# Altium footprint library HamedLib.PcbLib: 221 footprints (part 7 of 14)
Each footprint in its own frame and in the unit in brackets; x right, y up, seen from the top. Pads: shape width x height; smd on the part's side, far side on the other; paste and mask are expansions set on the pad; w line width, h text height; cw(c..) or ccw(c..) is an arc to the next point about the centre after c.
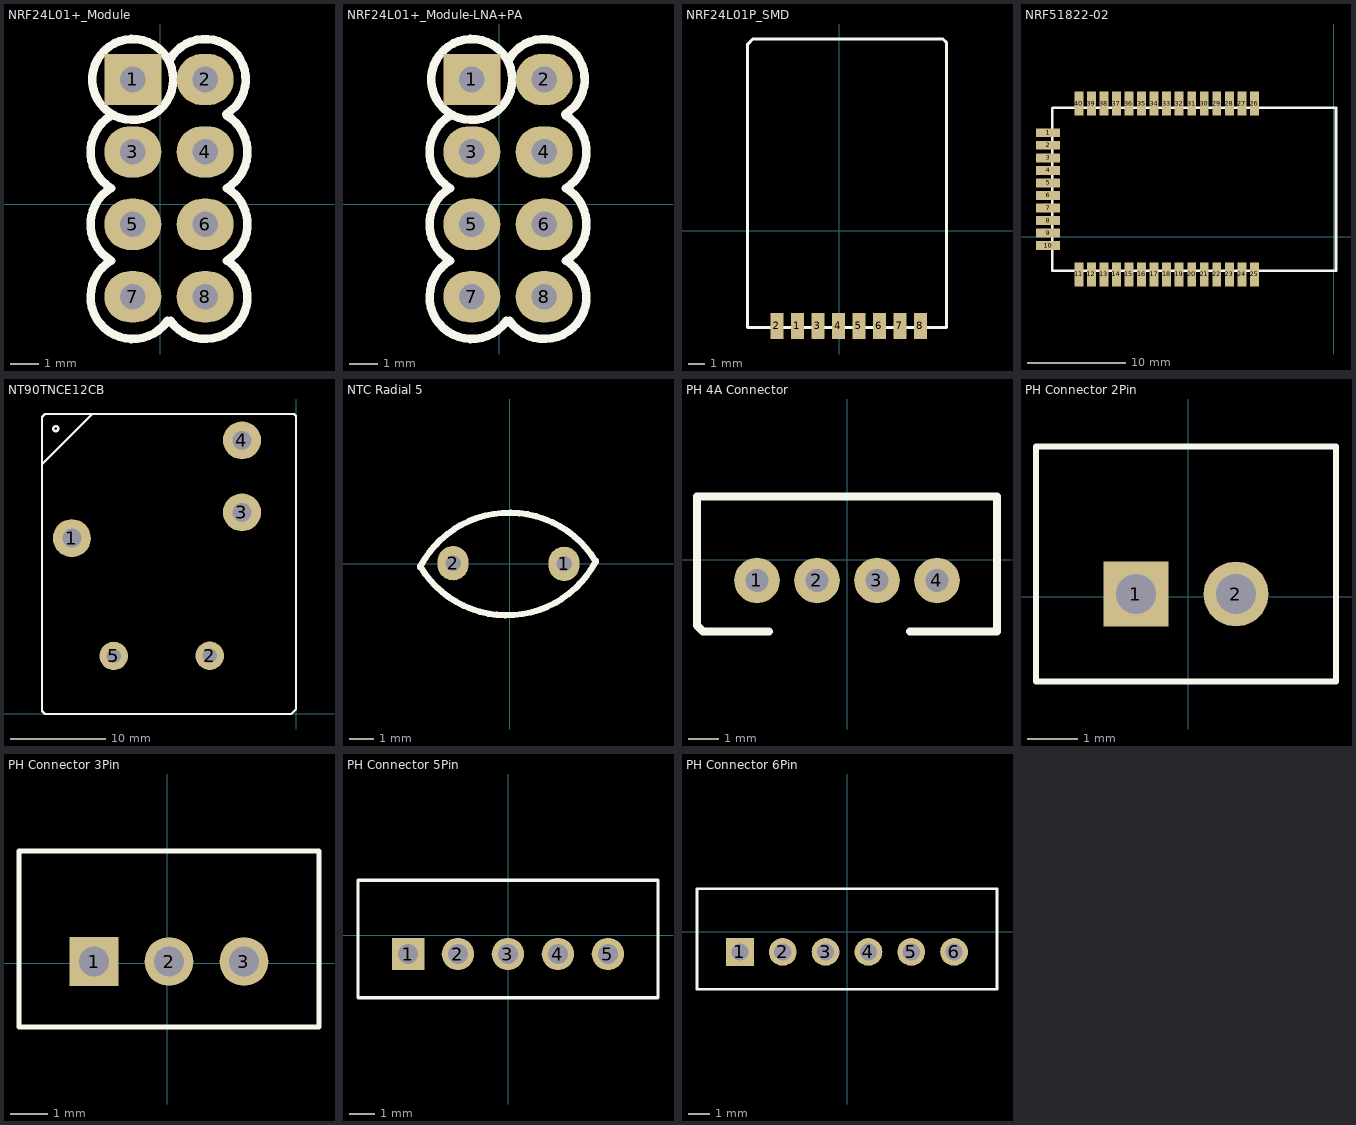
[diagram p6: the footprints below, top view; thin cyan lines are the x and y axes]

## NRF24L01+_Module [mm]
height 9
pads (8):
  rect 2x1.8 hole 0.9: 1(-0.965,4.369)
  oval 2x1.8 hole 0.9: 2(1.575,4.369) 3(-0.965,1.829) 4(1.575,1.829) 5(-0.965,-0.711) 6(1.575,-0.711) 7(-0.965,-3.251) 8(1.575,-3.251)
Top Overlay:
  circle w0.3: c-0.965,4.369 r1.42
  lines w0.3: -1.75,-1.995 ccw(c-0.965,-3.251) 0.248,-4.101 ; -1.727,-1.981 cw(c-0.965,-0.711) -1.727,0.559 cw(c-0.965,1.829) -1.727,3.099 ; 0.334,5.058 cw(c1.575,4.369) 2.305,3.151 ; 0.361,-4.101 ccw(c1.575,-3.251) 2.337,-1.981 ccw(c1.575,-0.711) 2.337,0.559 ccw(c1.575,1.829) 2.337,3.099
3D body "NRF24L01Module.STEP": height 9.1, standoff -1, extent -2.333,-9.082 26.667,5.918

## NRF24L01+_Module-LNA+PA [mm]
height 9
pads (8):
  rect 2x1.8 hole 0.9: 1(-0.965,4.369)
  oval 2x1.8 hole 0.9: 2(1.575,4.369) 3(-0.965,1.829) 4(1.575,1.829) 5(-0.965,-0.711) 6(1.575,-0.711) 7(-0.965,-3.251) 8(1.575,-3.251)
Top Overlay:
  circle w0.3: c-0.965,4.369 r1.42
  lines w0.3: -1.75,-1.995 ccw(c-0.965,-3.251) 0.248,-4.101 ; -1.727,-1.981 cw(c-0.965,-0.711) -1.727,0.559 cw(c-0.965,1.829) -1.727,3.099 ; 0.334,5.058 cw(c1.575,4.369) 2.305,3.151 ; 0.361,-4.101 ccw(c1.575,-3.251) 2.337,-1.981 ccw(c1.575,-0.711) 2.337,0.559 ccw(c1.575,1.829) 2.337,3.099
3D body "NRF PA-LNA Module.STEP": height 12.57, standoff -0.98, extent -1.725,-8.275 46.975,42.375

## NRF24L01P_SMD [mm]
pads (8):
  rect 0.8x1.6 smd: 1(-2.567,-5.829) 2(-3.824,-5.829) 3(-1.31,-5.829) 4(-0.053,-5.829) 5(1.204,-5.829) 6(2.461,-5.829) 7(3.718,-5.829) 8(4.976,-5.829)
Top Overlay:
  lines w0.2: -5.624,-5.929 6.576,-5.929 6.576,11.56 6.364,11.771 -5.297,11.771 -5.624,11.445 -5.624,-5.929
3D body "NRF24L01Module SMD.STEP": height 1.28, standoff 0, extent -5.524,-6.329 6.476,11.671

## NRF51822-02 [mm]
pads (40):
  rect 2.45x0.9 smd: 1(-28.9,10.55) 2(-28.9,9.28) 3(-28.9,8.01) 4(-28.9,6.74) 5(-28.9,5.47) 6(-28.9,4.2) 7(-28.9,2.93) 8(-28.9,1.66) 9(-28.9,0.39) 10(-28.9,-0.88)
  rect 0.9x2.45 smd: 11(-25.79,-3.8) 12(-24.52,-3.8) 13(-23.25,-3.8) 14(-21.98,-3.8) 15(-20.71,-3.8) 16(-19.44,-3.8) 17(-18.17,-3.8) 18(-16.9,-3.8) 19(-15.63,-3.8) 20(-14.36,-3.8) 21(-13.09,-3.8) 22(-11.82,-3.8) 23(-10.55,-3.8) 24(-9.28,-3.8) 25(-8.01,-3.8) 26(-8.01,13.51) 27(-9.28,13.51) 28(-10.55,13.51) 29(-11.82,13.51) 30(-13.09,13.51) 31(-14.36,13.51) 32(-15.63,13.51) 33(-16.9,13.51) 34(-18.17,13.51) 35(-19.44,13.51) 36(-20.71,13.51) 37(-21.98,13.51) 38(-23.25,13.51) 39(-24.52,13.51) 40(-25.79,13.51)
Top Overlay:
  lines w0.254: -28.475,-3.4 0.25,-3.4 0.25,10.825 0.25,13.1 -28.4,13.1 -28.475,13.025 -28.475,-3.4

## NT90TNCE12CB [mm]
pads (5):
  round 4 hole 2: 1(-23.7,18.501) 3(-5.75,21.225) 4(-5.75,28.825)
  round 3 hole 1.5: 2(-9.15,6.101) 5(-19.275,6.075)
Top Overlay:
  circle w0.254: c-25.4,30.05 r0.261
  lines w0.254: -26.85,26.3 -21.55,31.6 -20.75,31.6 ; -9.404,6.1 -8.896,6.1 ; -9.15,5.846 -9.15,6.354 ; -26.85,0.25 -26.55,-0.05 -0.55,-0.05 -0.05,0.45 -0.05,31.375 -0.275,31.6 -26.55,31.6 -26.85,31.3 -26.85,11.35 -26.85,0.25
3D body "Relay-NT90TxxxSTEP.STEP": height 28, standoff -4.8, extent -26.7,0 0,31.65

## NTC Radial 5 [mm]
pads (2):
  oval 1.27x1.397 hole 0.635: 1(2.225,0) 2(-2.3,0.025)
Top Overlay:
  lines w0.254: -3.649,-0.139 cw(c-0.003,-2.016) 3.525,0.075 ; -3.649,-0.089 ccw(c-0.121,2.002) 3.525,0.125
3D body "User Library-RXE020-NTC.STEP": height 12.79, standoff -1.9, extent -3.625,-1.525 3.775,1.475

## PCBComponent_1 [mm]

## PCBComponent_1 - duplicate [mm]

## PCBComponent_1 - duplicate1 [mm]

## PCBComponent_1 - duplicate2 [mm]

## PCBComponent_1 - duplicate3 [mm]

## PH 4A Connector [mil]
pads (4):
  round 60 hole 30: 1(-118.11,-27.56) 2(-39.37,-27.56) 3(39.37,-27.56) 4(118.11,-27.56)
Top Overlay:
  lines w10: -102.36,-94.49 -188.98,-94.49 -196.85,-86.61 -196.85,82.68 196.85,82.68 196.85,-94.49 82.68,-94.49
3D body "62000411622.stp": height 239.17, standoff -132.69, extent -196.85,-99.4 196.85,83.67

## PH Connector 2Pin [mm]
pads (2):
  rect 1.3x1.3 hole 0.8: 1(-1.05,0.05)
  round 1.3 hole 0.8: 2(0.95,0.05)
Top Overlay:
  lines w0.127: -3.05,-1.7 -3.05,3 2.95,3 2.95,-1.7 -3.05,-1.7
3D body "62000211622.stp": height 6.07, standoff -3.37, extent -3.05,-1.575 2.95,3.075

## PH Connector 3Pin [mm]
pads (3):
  rect 1.3x1.3 hole 0.8: 1(-1.95,0.05)
  round 1.3 hole 0.8: 2(0.05,0.05) 3(2.05,0.05)
Top Overlay:
  lines w0.127: -3.95,-1.7 4.05,-1.7 4.05,3 -3.95,3 -3.95,-1.7
3D body "62000311622.stp": height 6.07, standoff -3.37, extent -3.95,-1.575 4.05,3.075

## PH Connector 5Pin [mm]
pads (5):
  rect 1.3x1.3 hole 0.8: 1(-4,-0.75)
  round 1.3 hole 0.8: 2(-2,-0.75) 3(0,-0.75) 4(2,-0.75) 5(4,-0.75)
Top Overlay:
  lines w0.127: -6,-2.5 6,-2.5 6,2.2 -6,2.2 -6,-2.5
3D body "62000511622.stp": height 6.07, standoff -3.37, extent -6,-2.375 6,2.275

## PH Connector 6Pin [mm]
pads (6):
  rect 1.3x1.3 hole 0.8: 1(-5,-0.95)
  round 1.3 hole 0.8: 2(-3,-0.95) 3(-1,-0.95) 4(1,-0.95) 5(3,-0.95) 6(5,-0.95)
Top Overlay:
  lines w0.127: -7,-2.7 -7,2 7,2 7,-2.7 -7,-2.7
3D body "62000611622.stp": height 6.07, standoff -3.37, extent -7,-2.575 7,2.075